# Altium footprint library 1541 Interface for ZX-81.PcbLib: 24 footprints (part 2 of 2)
Each footprint in its own frame and in the unit in brackets; x right, y up, seen from the top. Pads: shape width x height; smd on the part's side, far side on the other; paste and mask are expansions set on the pad; w line width, h text height; cw(c..) or ccw(c..) is an arc to the next point about the centre after c.
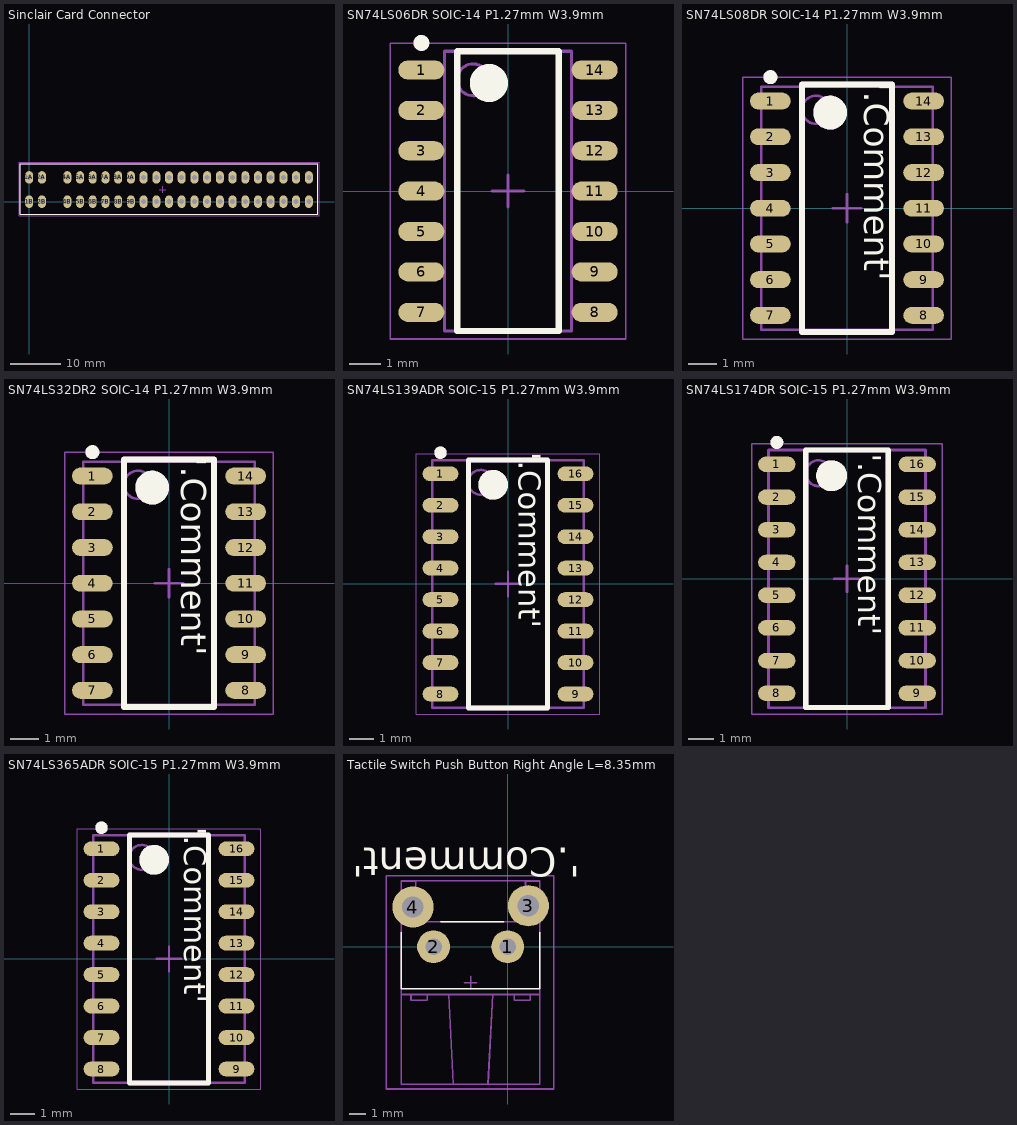
[diagram p1: the footprints below, top view; thin cyan lines are the x and y axes]

## Sinclair Card Connector [mm] "C64 Expansion Port EDGE Connector Straight"
pads (44):
  oval 1.6x2.5 hole 1: 1A(0,4.85) 1B(0,0) 2A(2.54,4.85) 2B(2.54,0) 4A(7.62,4.85) 4B(7.62,0) 5A(10.16,4.85) 5B(10.16,0) 6A(12.7,4.85) 6B(12.7,0) 7A(15.24,4.85) 7B(15.24,0) 8A(17.78,4.85) 8B(17.78,0) 9A(20.32,4.85) 9B(20.32,0) 10A(22.86,4.85) 10B(22.86,0) 11A(25.4,4.85) 11B(25.4,0) 12A(27.94,4.85) 12B(27.94,0) 13A(30.48,4.85) 13B(30.48,0) 14A(33.02,4.85) 14B(33.02,0) 15A(35.56,4.85) 15B(35.56,0) 16A(38.1,4.85) 16B(38.1,0) 17A(40.64,4.85) 17B(40.64,0) 18A(43.18,4.85) 18B(43.18,0) 19A(45.72,4.85) 19B(45.72,0) 20A(48.26,4.85) 20B(48.26,0) 21A(50.8,4.85) 21B(50.8,0) 22A(53.34,4.85) 22B(53.34,0) 23A(55.88,4.85) 23B(55.88,0)
Top Overlay:
  lines w0.2: -1.778,-2.54 57.658,-2.54 57.658,7.62 -1.778,7.62 -1.778,-2.54
Top 3D Body:
  lines w0.1: -1.778,-2.54 57.69,-2.54 57.69,7.61 -1.778,7.61 -1.778,-2.54
Top Courtyard:
  lines w0.1: -2.032,-2.794 -2.032,7.874 57.912,7.874 57.912,-2.794 -2.032,-2.794
  lines w0.2: 26.035,2.425 27.305,2.425 ; 26.67,1.79 26.67,3.06
Top Assembly:
  lines w0.2: -1.778,-2.54 -1.778,7.62 57.658,7.62 57.658,-2.54 -1.778,-2.54
3D body "ZX-81 EDGE Connector.stp": height 20.7, standoff -8, extent -1.81,-2.59 57.69,7.61

## SN74LS06DR SOIC-14 P1.27mm W3.9mm [mm] "SOIC, 14-Leads, Body 8,65x3,90mm, Pitch 1,27mm, IPC Medium Density"
height 1.75
pads (14):
  oval 1.45x0.6 smd: 1(-2.725,3.81) 2(-2.725,2.54) 3(-2.725,1.27) 4(-2.725,0) 5(-2.725,-1.27) 6(-2.725,-2.54) 7(-2.725,-3.81) 8(2.725,-3.81) 9(2.725,-2.54) 10(2.725,-1.27) 11(2.725,0) 12(2.725,1.27) 13(2.725,2.54) 14(2.725,3.81)
Top Overlay:
  circle w0.25: c-2.725,4.66 r0.125
  circle w0.6: c-0.6,3.4 r0.3
  lines w0.2: -1.6,-4.4 -1.6,4.4 1.6,4.4 1.6,-4.4 -1.6,-4.4
Top 3D Body:
  circle w0.1: c-1.1,3.5 r0.5
  lines w0.1: -2,-4.4 -2,4.4 2,4.4 2,-4.4 -2,-4.4
Top Courtyard:
  lines w0.05: -3.7,-4.65 -3.7,4.65 3.7,4.65 3.7,-4.65 -3.7,-4.65
  lines w0.1: -0.5,0 0.5,0 ; 0,-0.5 0,0.5
3D body "SN74LS06DR SOIC-14 W3.9mm P1,27mm.stp": height 1.54, standoff -0.05, extent -3.013,-4.325 2.991,4.325

## SN74LS08DR SOIC-14 P1.27mm W3.9mm [mm] "SOIC, 14-Leads, Body 8,65x3,90mm, Pitch 1,27mm, IPC Medium Density"
height 1.75
pads (14):
  oval 1.45x0.6 smd: 1(-2.725,3.81) 2(-2.725,2.54) 3(-2.725,1.27) 4(-2.725,0) 5(-2.725,-1.27) 6(-2.725,-2.54) 7(-2.725,-3.81) 8(2.725,-3.81) 9(2.725,-2.54) 10(2.725,-1.27) 11(2.725,0) 12(2.725,1.27) 13(2.725,2.54) 14(2.725,3.81)
Top Overlay:
  circle w0.25: c-2.725,4.66 r0.125
  circle w0.6: c-0.6,3.4 r0.3
  lines w0.2: -1.6,-4.4 -1.6,4.4 1.6,4.4 1.6,-4.4 -1.6,-4.4
  text "'.Comment'" at 0.311,4.477 h1.54
Top 3D Body:
  circle w0.1: c-1.1,3.5 r0.5
  lines w0.1: -3.048,-4.318 -3.048,4.318 3.048,4.318 3.048,-4.318 -3.048,-4.318
Top Courtyard:
  lines w0.05: -3.7,-4.65 -3.7,4.65 3.7,4.65 3.7,-4.65 -3.7,-4.65
  lines w0.1: -0.5,0 0.5,0 ; 0,-0.5 0,0.5
Top Assembly:
  circle w0.25: c-2.725,4.66 r0.125
  circle w0.6: c-0.6,3.4 r0.3
  lines w0.2: -1.6,-4.4 -1.6,4.4 1.6,4.4 1.6,-4.4 -1.6,-4.4
  text "'.Comment'" at 0.311,4.477 h1.54
  text "'.Designator'" at -1.033,-6.368 h2
3D body "SN74LS08DR SOIC-14 W3.9mm P1,27mm.stp": height 1.54, standoff -0.05, extent -3.013,-4.325 2.991,4.325

## SN74LS32DR2 SOIC-14 P1.27mm W3.9mm [mm] "SOIC, 14-Leads, Body 8,65x3,90mm, Pitch 1,27mm, IPC Medium Density"
height 1.75
pads (14):
  oval 1.45x0.6 smd: 1(-2.725,3.81) 2(-2.725,2.54) 3(-2.725,1.27) 4(-2.725,0) 5(-2.725,-1.27) 6(-2.725,-2.54) 7(-2.725,-3.81) 8(2.725,-3.81) 9(2.725,-2.54) 10(2.725,-1.27) 11(2.725,0) 12(2.725,1.27) 13(2.725,2.54) 14(2.725,3.81)
Top Overlay:
  circle w0.6: c-0.6,3.4 r0.3
  circle w0.25: c-2.725,4.66 r0.125
  lines w0.2: -1.6,-4.4 1.6,-4.4 1.6,4.4 -1.6,4.4 -1.6,-4.4
  text "'.Comment'" at 0.125,4.477 h1.54
Top 3D Body:
  circle w0.1: c-1.1,3.5 r0.5
  lines w0.1: -3.048,-4.318 3.048,-4.318 3.048,4.318 -3.048,4.318 -3.048,-4.318
Top Courtyard:
  lines w0.05: -3.7,-4.65 3.7,-4.65 3.7,4.65 -3.7,4.65 -3.7,-4.65
  lines w0.1: -0.5,0 0.5,0 ; 0,-0.5 0,0.5
Top Assembly:
  circle w0.6: c-0.6,3.4 r0.3
  circle w0.25: c-2.725,4.66 r0.125
  lines w0.2: -1.6,-4.4 1.6,-4.4 1.6,4.4 -1.6,4.4 -1.6,-4.4
  text "'.Comment'" at 0.125,4.477 h1.54
3D body "SN74LS32DR2 SOIC-14 W3.9mm P1,27mm.stp": height 1.54, standoff -0.05, extent -3.013,-4.325 2.991,4.325

## SN74LS139ADR SOIC-15 P1.27mm W3.9mm [mm] "SOIC, 16-Leads, Body 9,90x3,90mm, Pitch 1,27mm, IPC Medium Density"
height 1.75
pads (16):
  oval 1.45x0.6 smd: 1(-2.725,4.445) 2(-2.725,3.175) 3(-2.725,1.905) 4(-2.725,0.635) 5(-2.725,-0.635) 6(-2.725,-1.905) 7(-2.725,-3.175) 8(-2.725,-4.445) 9(2.725,-4.445) 10(2.725,-3.175) 11(2.725,-1.905) 12(2.725,-0.635) 13(2.725,0.635) 14(2.725,1.905) 15(2.725,3.175) 16(2.725,4.445)
Top Overlay:
  circle w0.25: c-2.725,5.295 r0.125
  circle w0.6: c-0.6,4 r0.3
  lines w0.2: -1.6,-5 -1.6,5 1.6,5 1.6,-5 -1.6,-5
  text "'.Comment'" at 0.125,5.318 h1.54
Top 3D Body:
  circle w0.1: c-1.1,4.1 r0.5
  lines w0.1: -3.048,-5 -3.048,5 3.048,5 3.048,-5 -3.048,-5
Top Courtyard:
  lines w0.05: -3.7,-5.25 -3.7,5.25 3.7,5.25 3.7,-5.25 -3.7,-5.25
  lines w0.1: -0.5,0 0.5,0 ; 0,-0.5 0,0.5
Top Assembly:
  circle w0.25: c-2.725,5.295 r0.125
  circle w0.6: c-0.6,4 r0.3
  lines w0.2: -1.6,-5 -1.6,5 1.6,5 1.6,-5 -1.6,-5
  text "'.Comment'" at 0.125,5.318 h1.54
  text "'.Designator'" at -0.806,-7.004 h2
3D body "SN74LS139ADR SOIC-16.stp": height 1.54, standoff 0, extent -3.013,-4.95 3.013,4.95

## SN74LS174DR SOIC-15 P1.27mm W3.9mm [mm] "SOIC, 16-Leads, Body 9,90x3,90mm, Pitch 1,27mm, IPC Medium Density"
height 1.75
pads (16):
  oval 1.45x0.6 smd: 1(-2.725,4.445) 2(-2.725,3.175) 3(-2.725,1.905) 4(-2.725,0.635) 5(-2.725,-0.635) 6(-2.725,-1.905) 7(-2.725,-3.175) 8(-2.725,-4.445) 9(2.725,-4.445) 10(2.725,-3.175) 11(2.725,-1.905) 12(2.725,-0.635) 13(2.725,0.635) 14(2.725,1.905) 15(2.725,3.175) 16(2.725,4.445)
Top Overlay:
  circle w0.6: c-0.6,4 r0.3
  circle w0.25: c-2.725,5.295 r0.125
  lines w0.2: -1.6,-5 1.6,-5 1.6,5 -1.6,5 -1.6,-5
  text "'.Comment'" at 0.126,4.859 h1.54
Top 3D Body:
  circle w0.1: c-1.1,4.1 r0.5
  lines w0.1: -3.048,-5 3.048,-5 3.048,5 -3.048,5 -3.048,-5
Top Courtyard:
  lines w0.05: -3.7,-5.25 3.7,-5.25 3.7,5.25 -3.7,5.25 -3.7,-5.25
  lines w0.1: -0.5,0 0.5,0 ; 0,-0.5 0,0.5
Top Assembly:
  circle w0.6: c-0.6,4 r0.3
  circle w0.25: c-2.725,5.295 r0.125
  lines w0.2: -1.6,-5 1.6,-5 1.6,5 -1.6,5 -1.6,-5
  text "'.Designator'" at -1.036,-7 h2
  text "'.Comment'" at 0.126,4.859 h1.54
3D body "SN74LS174DR SOIC-16.stp": height 1.54, standoff 0, extent -3.013,-4.95 3.013,4.95

## SN74LS365ADR SOIC-15 P1.27mm W3.9mm [mm] "SOIC, 16-Leads, Body 9,90x3,90mm, Pitch 1,27mm, IPC Medium Density"
height 1.75
pads (16):
  oval 1.45x0.6 smd: 1(-2.725,4.445) 2(-2.725,3.175) 3(-2.725,1.905) 4(-2.725,0.635) 5(-2.725,-0.635) 6(-2.725,-1.905) 7(-2.725,-3.175) 8(-2.725,-4.445) 9(2.725,-4.445) 10(2.725,-3.175) 11(2.725,-1.905) 12(2.725,-0.635) 13(2.725,0.635) 14(2.725,1.905) 15(2.725,3.175) 16(2.725,4.445)
Top Overlay:
  circle w0.6: c-0.6,4 r0.3
  circle w0.25: c-2.725,5.295 r0.125
  lines w0.2: -1.6,-5 1.6,-5 1.6,5 -1.6,5 -1.6,-5
  text "'.Comment'" at 0.31,5.318 h1.54
Top 3D Body:
  circle w0.1: c-1.1,4.1 r0.5
  lines w0.1: -3.048,-5 3.048,-5 3.048,5 -3.048,5 -3.048,-5
Top Courtyard:
  lines w0.05: -3.7,-5.25 3.7,-5.25 3.7,5.25 -3.7,5.25 -3.7,-5.25
  lines w0.1: -0.5,0 0.5,0 ; 0,-0.5 0,0.5
Top Assembly:
  circle w0.6: c-0.6,4 r0.3
  circle w0.25: c-2.725,5.295 r0.125
  lines w0.2: -1.6,-5 1.6,-5 1.6,5 -1.6,5 -1.6,-5
  text "'.Designator'" at -1.031,-7.003 h2
  text "'.Comment'" at 0.31,5.318 h1.54
3D body "SN74LS365ADR SOIC-16.stp": height 1.54, standoff 0, extent -3.013,-4.95 3.013,4.95

## Tactile Switch Push Button Right Angle L=8.35mm [mm] "Tactile Switch SPST-NO Side Actuated Through Hole, Right Angle 1-1825027-1"
height 1.75
pads (4):
  round 2 hole 1: 1(0,0) 2(-4.5,0)
  round 2.5 hole 1.3: 3(1.255,2.49) 4(-5.755,2.413)
Top Overlay:
  lines w0.1: -6.454,0.889 -6.454,-2.54 1.956,-2.54 1.956,0.889 ; -4.064,1.524 -0.254,1.524
  text "'.Comment'" at 4.406,6.58 h3
Top 3D Body:
  lines w0.1: -6.455,-8.351 1.955,-8.351 1.955,4.001 -6.455,4.001 -6.455,-8.351
Top Courtyard:
  lines w0.1: -2.631,-2.175 -1.869,-2.175 ; -2.25,-2.556 -2.25,-1.794 ; -7.366,-8.636 2.794,-8.636 2.794,4.318 -7.366,4.318 -7.366,-8.636
Top Assembly:
  lines w0.1: -5.913,-2.896 -5.867,-2.896 -5.867,-3.251 -4.887,-3.251 -4.887,-2.895 ; -5.578,1.6 -5.578,3.988 -6.452,3.988 -6.452,1.528 ; -3.583,-2.895 -3.301,-8.357 -1.195,-8.357 -0.913,-2.895 ; 0.391,-2.895 0.391,-3.251 1.372,-3.251 1.372,-2.896 ; 1.082,1.6 1.082,3.988 1.956,3.988 1.956,1.528 ; -6.452,1.528 -6.452,-2.896 1.956,-2.896 1.956,1.528 ; -6.452,1.528 1.956,1.528
  text "'.Comment'" at 4.279,6.58 h3
  text "'.Designator'" at -0.229,3.837 h2
3D body "Tactile Switch SPST-NO Side Actuated Through Hole, Right Angle 1-1825027-1.stp": height 7.06, standoff -3.51, extent -6.45,-8.605 1.96,3.747